# Altium footprint library LukaLIBRARY.PcbLib: 784 footprints (part 11 of 49)
Each footprint in its own frame and in the unit in brackets; x right, y up, seen from the top. Pads: shape width x height; smd on the part's side, far side on the other; paste and mask are expansions set on the pad; w line width, h text height; cw(c..) or ccw(c..) is an arc to the next point about the centre after c.
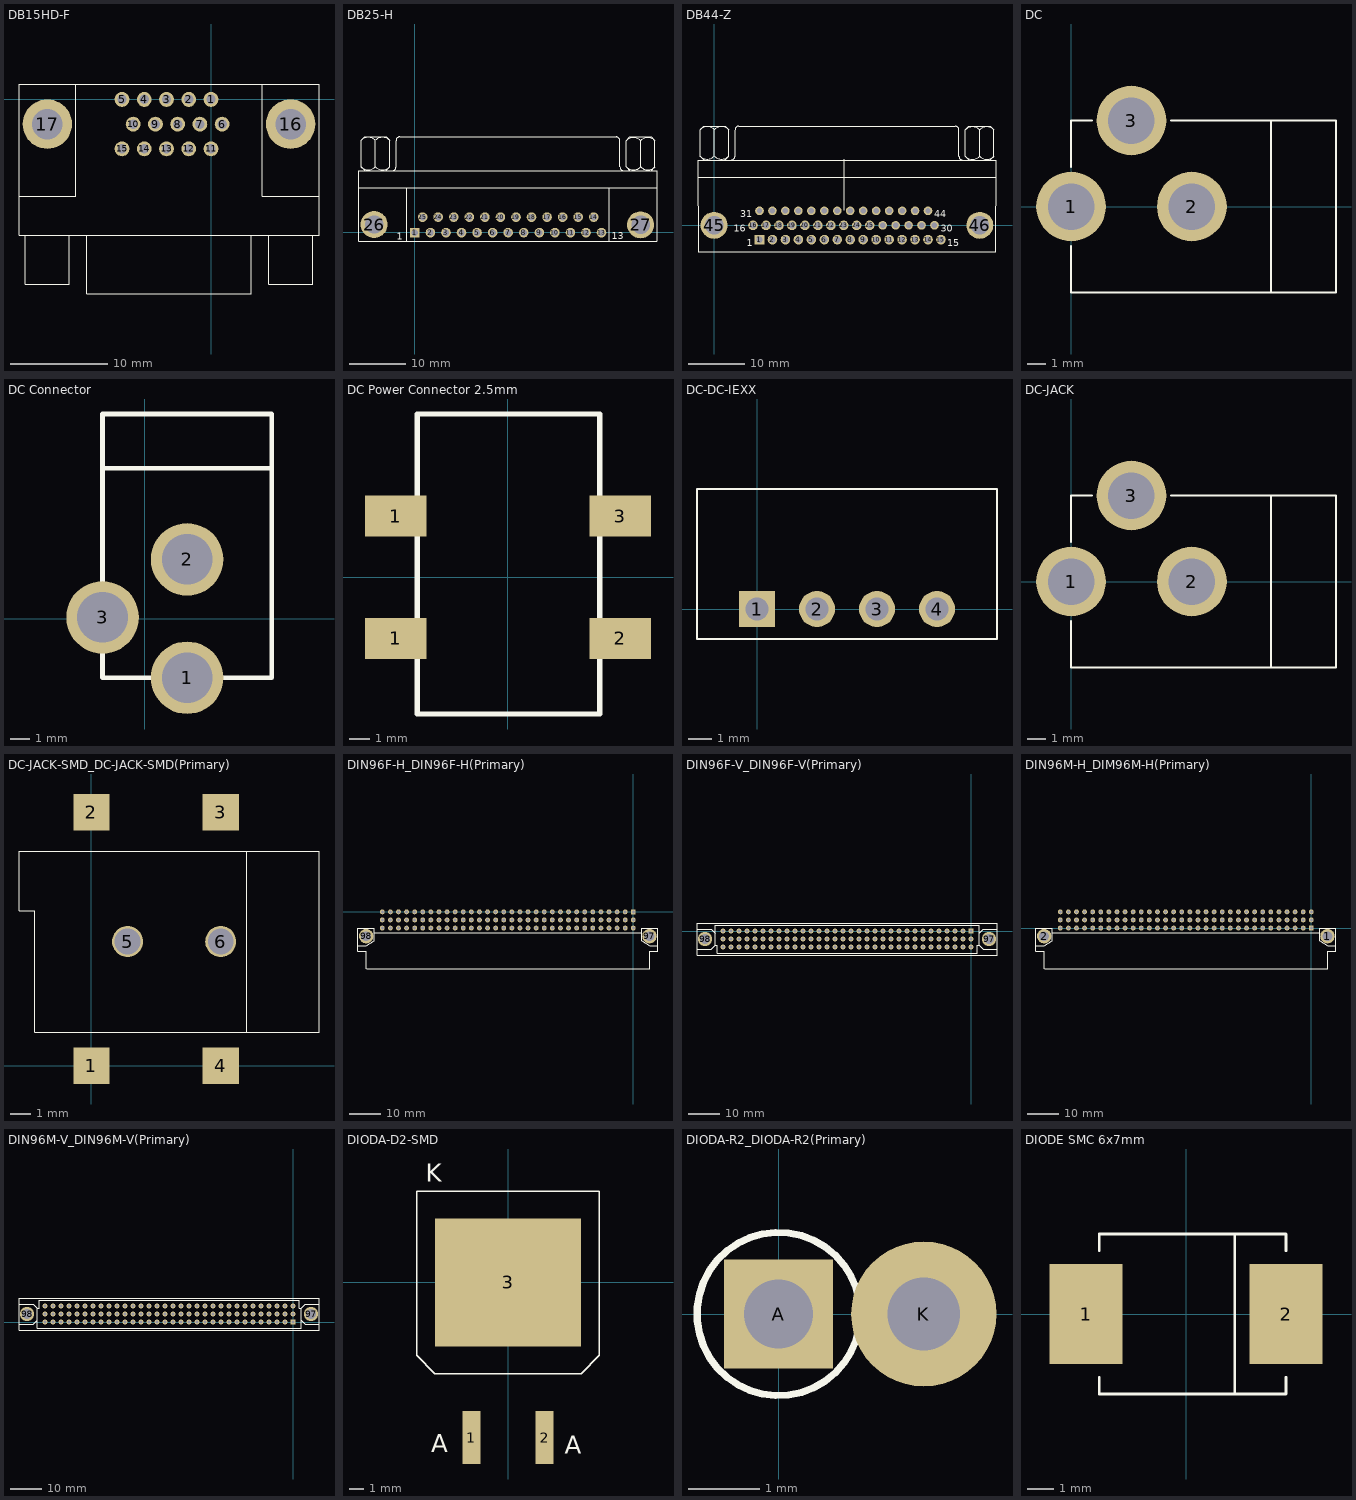
[diagram p10: the footprints below, top view; thin cyan lines are the x and y axes]

## DB15HD-F [mil]
pads (17):
  round 60 hole 38: 1(0,0) 2(-89.96,0) 3(-179.92,0) 4(-269.88,0) 5(-359.84,0) 6(44.98,-100) 7(-44.98,-100) 8(-134.94,-100) 9(-224.9,-100) 10(-314.86,-100) 11(0,-200) 12(-89.96,-200) 13(-179.92,-200) 14(-269.88,-200) 15(-359.84,-200)
  round 200 hole 124: 16(322.24,-100) 17(-662.01,-100)
Top Overlay:
  lines w1: -776.57,-392.52 -547.44,-392.52 -547.44,61.42 ; -750.59,-550 -750.59,-746.85 -573.43,-746.85 -573.43,-550 ; -502.95,-550 -502.95,-786.22 163.19,-786.22 163.19,-550 ; 207.68,61.42 207.68,-392.52 436.81,-392.52 ; 233.66,-550 233.66,-746.85 410.83,-746.85 410.83,-550 ; -776.57,-550 -776.57,61.42 436.81,61.42 436.81,-550 -776.57,-550

## DB25-H [mm]
pads (27):
  rect 1.7x1.7 hole 1.1: 1(0.023,-0.049)
  round 1.7 hole 1.1: 2(2.767,-0.049) 3(5.51,-0.049) 4(8.254,-0.049) 5(10.997,-0.049) 6(13.74,-0.049) 7(16.483,-0.049) 8(19.226,-0.049) 9(21.97,-0.049) 10(24.713,-0.049) 11(27.456,-0.049) 12(30.199,-0.049) 13(32.942,-0.049) 14(31.571,2.694) 15(28.828,2.694) 16(26.084,2.694) 17(23.341,2.694) 18(20.598,2.694) 19(17.855,2.694) 20(15.112,2.694) 21(12.368,2.694) 22(9.625,2.694) 23(6.882,2.694) 24(4.139,2.694) 25(1.396,2.694)
  round 4.76 hole 3.26: 26(-7.163,1.397) 27(39.825,1.346)
Top Overlay:
  lines w0.2: -9.855,-1.524 42.723,-1.549 ; -9.837,-1.529 -9.837,10.871 42.748,10.871 ; -9.837,7.871 42.748,7.874 ; -9.475,16.221 -9.475,11.571 -8.84,10.936 ; -9.475,16.236 -8.84,16.871 -5.03,16.871 -4.395,16.236 ; -6.935,11.571 -6.935,16.221 ; -5.03,10.936 -4.395,11.571 -4.395,16.221 ; -4.395,14.957 -4.395,15.169 ; -3.997,10.876 ccw(c-3.997,11.571) -3.302,11.571 -3.302,16.171 ; -3.297,16.176 cw(c-2.602,16.176) -2.602,16.871 ; -2.642,16.84 35.495,16.846 cw(c35.495,16.151) 36.19,16.151 ; -1.437,-1.529 -1.437,7.871 ; 34.33,-1.554 34.33,7.846 ; 36.195,16.146 36.195,11.546 ccw(c36.89,11.546) 36.89,10.851 ; 37.293,16.196 37.293,11.545 37.928,10.91 ; 37.293,16.211 37.928,16.846 41.738,16.846 42.373,16.211 ; 39.833,11.545 39.833,16.196 ; 41.738,10.91 42.373,11.545 42.373,16.196 ; 42.373,14.932 42.373,15.144 ; 42.73,-1.554 42.73,10.846
  lines w0.203: -9.477,11.568 ccw(c-8.205,12.841) -6.933,11.568 ; -9.475,16.221 cw(c-8.203,14.949) -6.931,16.221 ; -6.94,16.221 cw(c-5.667,14.949) -4.395,16.221 ; -6.937,11.568 ccw(c-5.665,12.841) -4.393,11.568 ; 37.29,11.543 ccw(c38.563,12.815) 39.835,11.543 ; 37.293,16.196 cw(c38.565,14.924) 39.837,16.196 ; 39.828,16.196 cw(c41.1,14.924) 42.373,16.196 ; 39.83,11.543 ccw(c41.103,12.815) 42.375,11.543
  text "13" at 34.722,-1.168 h1.25
  text "1" at -3.175,-1.27 h1.25

## DB44-Z [mil]
pads (46):
  rect 66.93x66.93 hole 43.31: 1(315,-100)
  round 66.93 hole 43.31: 2(405,-100) 3(495,-100) 4(585,-100) 5(675,-100) 6(765,-100) 7(855,-100) 8(945,-100) 9(1035,-100) 10(1125,-100) 11(1215,-100) 12(1305,-100) 13(1395,-100) 14(1485,-100) 15(1575,-100) 16(270,0) 17(360,0) 18(450,0) 19(540,0) 20(630,0) 21(720,0) 22(810,0) 23(900,0) 24(990,0) 25(1080,0)
  round 60 hole 38: 26(1170,0) 27(1260,0) 28(1350,0) 29(1440,0) 30(1530,0) 31(315,100) 32(405,100) 33(495,100) 34(585,100) 35(675,100) 36(765,100) 37(855,100) 38(945,100) 39(1035,100) 40(1125,100) 41(1215,100) 42(1305,100) 43(1395,100) 44(1485,100)
  round 187.4 hole 128.35: 45(0,0) 46(1845,0)
Top Overlay:
  lines w3.94: 905,105 905,460
  lines w7.87: -112.3,334.89 1958,335 ; -98.04,663.63 -98.04,480.54 -73.04,455.54 ; -98.04,664.22 -73.04,689.22 76.96,689.22 101.96,664.22 ; 1.96,480.54 1.96,663.63 ; 76.96,455.54 101.96,480.54 101.96,663.63 ; 101.96,613.87 101.96,622.21 ; 117.62,453.2 ccw(c117.62,480.56) 144.98,480.56 144.98,661.66 ; 145.18,661.86 cw(c172.54,661.86) 172.54,689.22 ; 171,688 1672.46,688.22 cw(c1672.46,660.86) 1699.82,660.86 ; 1700.02,660.66 1700.02,479.56 ccw(c1727.38,479.56) 1727.38,452.2 ; 1743.21,662.63 1743.21,479.54 1768.21,454.54 ; 1743.21,663.22 1768.21,688.22 1918.21,688.22 1943.21,663.22 ; 1843.21,479.54 1843.21,662.63 ; 1918.21,454.54 1943.21,479.54 1943.21,662.63 ; 1943.21,612.87 1943.21,621.21 ; 1957.3,452 1955,-185 -110,-185 -112.3,453 1958,453
  lines w8: -98.13,480.45 ccw(c-48.04,530.54) 2.05,480.45 ; -98.04,663.63 cw(c-47.95,613.54) 2.13,663.63 ; 1.79,663.63 cw(c51.87,613.54) 101.96,663.63 ; 1.87,480.45 ccw(c51.96,530.54) 102.05,480.45 ; 1743.13,479.45 ccw(c1793.21,529.54) 1843.3,479.45 ; 1743.21,662.63 cw(c1793.3,612.54) 1843.39,662.63 ; 1843.04,662.63 cw(c1893.13,612.54) 1943.21,662.63 ; 1843.13,479.45 ccw(c1893.21,529.54) 1943.3,479.45
  text "1" at 225,-145 h49.21
  text "15" at 1620,-145 h49.21
  text "44" at 1530,55 h49.21
  text "16" at 135,-45 h49.21
  text "30" at 1575,-45 h49.21
  text "31" at 180,55 h49.21

## DC [mil]
pads (3):
  round 150 hole 100 mask-1000: 1(0,0) 2(260,0) 3(130,185)
Top Overlay:
  lines w5: 0,-85 0,-185 570,-185 570,185 215,185 ; 0,85 0,185 45,185 ; 430,-185 430,185
Top Solder:
  region: 0,-75.36 14.7,-73.91 28.84,-69.63 41.87,-62.66 53.29,-53.29 62.66,-41.87 69.63,-28.84 73.91,-14.7 75.36,0 73.91,14.7 69.63,28.84 62.66,41.87 53.29,53.29 41.87,62.66 28.84,69.63 14.7,73.91 0,75.36 -14.7,73.91 -28.84,69.63 -41.87,62.66 -53.29,53.29 -62.66,41.87 -69.63,28.84 -73.91,14.7 -75.36,0 -73.91,-14.7 -69.63,-28.84 -62.66,-41.87 -53.29,-53.29 -41.87,-62.66 -28.84,-69.63 -14.7,-73.91
  region: 260,-75.36 274.7,-73.91 288.84,-69.63 301.87,-62.66 313.29,-53.29 322.66,-41.87 329.63,-28.84 333.91,-14.7 335.36,0 333.91,14.7 329.63,28.84 322.66,41.87 313.29,53.29 301.87,62.66 288.84,69.63 274.7,73.91 260,75.36 245.3,73.91 231.16,69.63 218.13,62.66 206.71,53.29 197.34,41.87 190.37,28.84 186.09,14.7 184.64,0 186.09,-14.7 190.37,-28.84 197.34,-41.87 206.71,-53.29 218.13,-62.66 231.16,-69.63 245.3,-73.91
  region: 130,109.64 144.7,111.09 158.84,115.37 171.87,122.34 183.29,131.71 192.66,143.13 199.63,156.16 203.91,170.3 205.36,185 203.91,199.7 199.63,213.84 192.66,226.87 183.29,238.29 171.87,247.66 158.84,254.63 144.7,258.91 130,260.36 115.3,258.91 101.16,254.63 88.13,247.66 76.71,238.29 67.34,226.87 60.37,213.84 56.09,199.7 54.64,185 56.09,170.3 60.37,156.16 67.34,143.13 76.71,131.71 88.13,122.34 101.16,115.37 115.3,111.09
Bottom Solder:
  region: 0,-75.36 14.7,-73.91 28.84,-69.63 41.87,-62.66 53.29,-53.29 62.66,-41.87 69.63,-28.84 73.91,-14.7 75.36,0 73.91,14.7 69.63,28.84 62.66,41.87 53.29,53.29 41.87,62.66 28.84,69.63 14.7,73.91 0,75.36 -14.7,73.91 -28.84,69.63 -41.87,62.66 -53.29,53.29 -62.66,41.87 -69.63,28.84 -73.91,14.7 -75.36,0 -73.91,-14.7 -69.63,-28.84 -62.66,-41.87 -53.29,-53.29 -41.87,-62.66 -28.84,-69.63 -14.7,-73.91
  region: 260,-75.36 274.7,-73.91 288.84,-69.63 301.87,-62.66 313.29,-53.29 322.66,-41.87 329.63,-28.84 333.91,-14.7 335.36,0 333.91,14.7 329.63,28.84 322.66,41.87 313.29,53.29 301.87,62.66 288.84,69.63 274.7,73.91 260,75.36 245.3,73.91 231.16,69.63 218.13,62.66 206.71,53.29 197.34,41.87 190.37,28.84 186.09,14.7 184.64,0 186.09,-14.7 190.37,-28.84 197.34,-41.87 206.71,-53.29 218.13,-62.66 231.16,-69.63 245.3,-73.91
  region: 130,109.64 144.7,111.09 158.84,115.37 171.87,122.34 183.29,131.71 192.66,143.13 199.63,156.16 203.91,170.3 205.36,185 203.91,199.7 199.63,213.84 192.66,226.87 183.29,238.29 171.87,247.66 158.84,254.63 144.7,258.91 130,260.36 115.3,258.91 101.16,254.63 88.13,247.66 76.71,238.29 67.34,226.87 60.37,213.84 56.09,199.7 54.64,185 56.09,170.3 60.37,156.16 67.34,143.13 76.71,131.71 88.13,122.34 101.16,115.37 115.3,111.09

## DC Connector [mil]
pads (3):
  round 150 hole 105: 1(87.5,-122.5) 2(87.5,122.5) 3(-87.5,2.5)
Top Overlay:
  lines w10: -87.5,311.02 262.5,311.02 ; -87.5,-122.5 262.5,-122.5 262.5,423.23 -87.5,423.23 -87.5,-122.5

## DC Power Connector 2.5mm [mm]
pads (4):
  rect 3x2 smd: 1(-5.5,-3) 1(-5.5,3) 2(5.5,-3) 3(5.5,3)
Top Overlay:
  lines w0.254: -4.45,-6.7 -4.45,8 4.5,8 4.5,-6.7 -4.45,-6.7

## DC-DC-IEXX [mil]
pads (4):
  rect 60x60 hole 38 mask-1000: 1(0,0)
  round 60 hole 38 mask-1000: 2(100,0) 3(200,0) 4(300,0)
Top Overlay:
  lines w3: -100,-50 400,-50 400,200 -100,200 -100,-50
Top Solder:
  region: 100,30.26 92.17,29.23 84.87,26.2 78.6,21.4 73.8,15.13 70.77,7.83 69.74,0 70.77,-7.83 73.8,-15.13 78.6,-21.4 84.87,-26.2 92.17,-29.23 100,-30.26 107.83,-29.23 115.13,-26.2 121.4,-21.4 126.2,-15.13 129.23,-7.83 130.26,0 129.23,7.83 126.2,15.13 121.4,21.4 115.13,26.2 107.83,29.23
  region: 300,30.26 292.17,29.23 284.87,26.2 278.6,21.4 273.8,15.13 270.77,7.83 269.74,0 270.77,-7.83 273.8,-15.13 278.6,-21.4 284.87,-26.2 292.17,-29.23 300,-30.26 307.83,-29.23 315.13,-26.2 321.4,-21.4 326.2,-15.13 329.23,-7.83 330.26,0 329.23,7.83 326.2,15.13 321.4,21.4 315.13,26.2 307.83,29.23
  region: 200,30.26 192.17,29.23 184.87,26.2 178.6,21.4 173.79,15.13 170.77,7.83 169.74,0 170.77,-7.83 173.79,-15.13 178.6,-21.4 184.87,-26.2 192.17,-29.23 200,-30.26 207.83,-29.23 215.13,-26.2 221.4,-21.4 226.21,-15.13 229.23,-7.83 230.26,0 229.23,7.83 226.21,15.13 221.4,21.4 215.13,26.2 207.83,29.23
  region: -30,-30 30,-30 30,30 -30,30
Bottom Solder:
  region: 100,30.26 92.17,29.23 84.87,26.2 78.6,21.4 73.8,15.13 70.77,7.83 69.74,0 70.77,-7.83 73.8,-15.13 78.6,-21.4 84.87,-26.2 92.17,-29.23 100,-30.26 107.83,-29.23 115.13,-26.2 121.4,-21.4 126.2,-15.13 129.23,-7.83 130.26,0 129.23,7.83 126.2,15.13 121.4,21.4 115.13,26.2 107.83,29.23
  region: 300,30.26 292.17,29.23 284.87,26.2 278.6,21.4 273.8,15.13 270.77,7.83 269.74,0 270.77,-7.83 273.8,-15.13 278.6,-21.4 284.87,-26.2 292.17,-29.23 300,-30.26 307.83,-29.23 315.13,-26.2 321.4,-21.4 326.2,-15.13 329.23,-7.83 330.26,0 329.23,7.83 326.2,15.13 321.4,21.4 315.13,26.2 307.83,29.23
  region: 200,30.26 192.17,29.23 184.87,26.2 178.6,21.4 173.79,15.13 170.77,7.83 169.74,0 170.77,-7.83 173.79,-15.13 178.6,-21.4 184.87,-26.2 192.17,-29.23 200,-30.26 207.83,-29.23 215.13,-26.2 221.4,-21.4 226.21,-15.13 229.23,-7.83 230.26,0 229.23,7.83 226.21,15.13 221.4,21.4 215.13,26.2 207.83,29.23
  region: -30,-30 30,-30 30,30 -30,30

## DC-JACK [mil]
pads (3):
  round 150 hole 100 mask-1000: 1(0,0) 2(260,0) 3(130,185)
Top Overlay:
  lines w5: 0,-85 0,-185 570,-185 570,185 215,185 ; 0,85 0,185 45,185 ; 430,-185 430,185
Top Solder:
  region: 130,109.64 144.7,111.09 158.84,115.37 171.87,122.34 183.29,131.71 192.66,143.13 199.63,156.16 203.91,170.3 205.36,185 203.91,199.7 199.63,213.84 192.66,226.87 183.29,238.29 171.87,247.66 158.84,254.63 144.7,258.91 130,260.36 115.3,258.91 101.16,254.63 88.13,247.66 76.71,238.29 67.34,226.87 60.37,213.84 56.09,199.7 54.64,185 56.09,170.3 60.37,156.16 67.34,143.13 76.71,131.71 88.13,122.34 101.16,115.37 115.3,111.09
  region: 260,-75.36 274.7,-73.91 288.84,-69.63 301.87,-62.66 313.29,-53.29 322.66,-41.87 329.63,-28.84 333.91,-14.7 335.36,0 333.91,14.7 329.63,28.84 322.66,41.87 313.29,53.29 301.87,62.66 288.84,69.63 274.7,73.91 260,75.36 245.3,73.91 231.16,69.63 218.13,62.66 206.71,53.29 197.34,41.87 190.37,28.84 186.09,14.7 184.64,0 186.09,-14.7 190.37,-28.84 197.34,-41.87 206.71,-53.29 218.13,-62.66 231.16,-69.63 245.3,-73.91
  region: 0,-75.36 14.7,-73.91 28.84,-69.63 41.87,-62.66 53.29,-53.29 62.66,-41.87 69.63,-28.84 73.91,-14.7 75.36,0 73.91,14.7 69.63,28.84 62.66,41.87 53.29,53.29 41.87,62.66 28.84,69.63 14.7,73.91 0,75.36 -14.7,73.91 -28.84,69.63 -41.87,62.66 -53.29,53.29 -62.66,41.87 -69.63,28.84 -73.91,14.7 -75.36,0 -73.91,-14.7 -69.63,-28.84 -62.66,-41.87 -53.29,-53.29 -41.87,-62.66 -28.84,-69.63 -14.7,-73.91
Bottom Solder:
  region: 130,109.64 144.7,111.09 158.84,115.37 171.87,122.34 183.29,131.71 192.66,143.13 199.63,156.16 203.91,170.3 205.36,185 203.91,199.7 199.63,213.84 192.66,226.87 183.29,238.29 171.87,247.66 158.84,254.63 144.7,258.91 130,260.36 115.3,258.91 101.16,254.63 88.13,247.66 76.71,238.29 67.34,226.87 60.37,213.84 56.09,199.7 54.64,185 56.09,170.3 60.37,156.16 67.34,143.13 76.71,131.71 88.13,122.34 101.16,115.37 115.3,111.09
  region: 260,-75.36 274.7,-73.91 288.84,-69.63 301.87,-62.66 313.29,-53.29 322.66,-41.87 329.63,-28.84 333.91,-14.7 335.36,0 333.91,14.7 329.63,28.84 322.66,41.87 313.29,53.29 301.87,62.66 288.84,69.63 274.7,73.91 260,75.36 245.3,73.91 231.16,69.63 218.13,62.66 206.71,53.29 197.34,41.87 190.37,28.84 186.09,14.7 184.64,0 186.09,-14.7 190.37,-28.84 197.34,-41.87 206.71,-53.29 218.13,-62.66 231.16,-69.63 245.3,-73.91
  region: 0,-75.36 14.7,-73.91 28.84,-69.63 41.87,-62.66 53.29,-53.29 62.66,-41.87 69.63,-28.84 73.91,-14.7 75.36,0 73.91,14.7 69.63,28.84 62.66,41.87 53.29,53.29 41.87,62.66 28.84,69.63 14.7,73.91 0,75.36 -14.7,73.91 -28.84,69.63 -41.87,62.66 -53.29,53.29 -62.66,41.87 -69.63,28.84 -73.91,14.7 -75.36,0 -73.91,-14.7 -69.63,-28.84 -62.66,-41.87 -53.29,-53.29 -41.87,-62.66 -28.84,-69.63 -14.7,-73.91

## DC-JACK-SMD_DC-JACK-SMD(Primary) [mil]
pads (6):
  rect 70x70 smd: 1(0,0) 2(0,490) 3(250,490) 4(250,0)
  round 60 hole 50 unplated: 5(70,240) 6(250,240)
Top Overlay:
  lines w1: 300,65 300,415 ; -140,300 -110,300 -110,65 440,65 440,415 -140,415 -140,300

## DIN96F-H_DIN96F-H(Primary) [mil]
pads (98):
  round 180 hole 120: 97(200,-300) 98(-3300,-300)
  rect 60x60 hole 38 mask-1000: A1(0,0)
  round 60 hole 38 mask-1000: A2(-100,0) A3(-200,0) A4(-300,0) A5(-400,0) A6(-500,0) A7(-600,0) A8(-700,0) A9(-800,0) A10(-900,0) A11(-1000,0) A12(-1100,0) A13(-1200,0) A14(-1300,0) A15(-1400,0) A16(-1500,0) A17(-1600,0) A18(-1700,0) A19(-1800,0) A20(-1900,0) A21(-2000,0) A22(-2100,0) A23(-2200,0) A24(-2300,0) A25(-2400,0) A26(-2500,0) A27(-2600,0) A28(-2700,0) A29(-2800,0) A30(-2900,0) A31(-3000,0) A32(-3100,0) B1(0,-100) B2(-100,-100) B3(-200,-100) B4(-300,-100) B5(-400,-100) B6(-500,-100) B7(-600,-100) B8(-700,-100) B9(-800,-100) B10(-900,-100) B11(-1000,-100) B12(-1100,-100) B13(-1200,-100) B14(-1300,-100) B15(-1400,-100) B16(-1500,-100) B17(-1600,-100) B18(-1700,-100) B19(-1800,-100) B20(-1900,-100) B21(-2000,-100) B22(-2100,-100) B23(-2200,-100) B24(-2300,-100) B25(-2400,-100) B26(-2500,-100) B27(-2600,-100) B28(-2700,-100) B29(-2800,-100) B30(-2900,-100) B31(-3000,-100) B32(-3100,-100) C1(0,-200) C2(-100,-200) C3(-200,-200) C4(-300,-200) C5(-400,-200) C6(-500,-200) C7(-600,-200) C8(-700,-200) C9(-800,-200) C10(-900,-200) C11(-1000,-200) C12(-1100,-200) C13(-1200,-200) C14(-1300,-200) C15(-1400,-200) C16(-1500,-200) C17(-1600,-200) C18(-1700,-200) C19(-1800,-200) C20(-1900,-200) C21(-2000,-200) C22(-2100,-200) C23(-2200,-200) C24(-2300,-200) C25(-2400,-200) C26(-2500,-200) C27(-2600,-200) C28(-2700,-200) C29(-2800,-200) C30(-2900,-200) C31(-3000,-200) C32(-3100,-200)
Top Overlay:
  lines w1: -3400,-420 -3300,-420 -3200,-355 -3200,-255 ; 105,-255 105,-355 205,-420 305,-420
  lines w10: -3300,-700 -3300,-485 -3400,-485 -3400,-205 -3200,-205 -3200,-255 105,-255 105,-205 305,-205 305,-485 205,-485 205,-700 -3295,-700
Top Solder:
  drawing of 96 lines, arcs and shapes, not listed
Bottom Solder:
  drawing of 96 lines, arcs and shapes, not listed

## DIN96F-V_DIN96F-V(Primary) [mil]
pads (98):
  round 180 hole 120: 97(225,-100) 98(-3325,-100)
  rect 60x60 hole 38 mask-1000: A1(0,0)
  round 60 hole 38 mask-1000: A2(-100,0) A3(-200,0) A4(-300,0) A5(-400,0) A6(-500,0) A7(-600,0) A8(-700,0) A9(-800,0) A10(-900,0) A11(-1000,0) A12(-1100,0) A13(-1200,0) A14(-1300,0) A15(-1400,0) A16(-1500,0) A17(-1600,0) A18(-1700,0) A19(-1800,0) A20(-1900,0) A21(-2000,0) A22(-2100,0) A23(-2200,0) A24(-2300,0) A25(-2400,0) A26(-2500,0) A27(-2600,0) A28(-2700,0) A29(-2800,0) A30(-2900,0) A31(-3000,0) A32(-3100,0) B1(0,-100) B2(-100,-100) B3(-200,-100) B4(-300,-100) B5(-400,-100) B6(-500,-100) B7(-600,-100) B8(-700,-100) B9(-800,-100) B10(-900,-100) B11(-1000,-100) B12(-1100,-100) B13(-1200,-100) B14(-1300,-100) B15(-1400,-100) B16(-1500,-100) B17(-1600,-100) B18(-1700,-100) B19(-1800,-100) B20(-1900,-100) B21(-2000,-100) B22(-2100,-100) B23(-2200,-100) B24(-2300,-100) B25(-2400,-100) B26(-2500,-100) B27(-2600,-100) B28(-2700,-100) B29(-2800,-100) B30(-2900,-100) B31(-3000,-100) B32(-3100,-100) C1(0,-200) C2(-100,-200) C3(-200,-200) C4(-300,-200) C5(-400,-200) C6(-500,-200) C7(-600,-200) C8(-700,-200) C9(-800,-200) C10(-900,-200) C11(-1000,-200) C12(-1100,-200) C13(-1200,-200) C14(-1300,-200) C15(-1400,-200) C16(-1500,-200) C17(-1600,-200) C18(-1700,-200) C19(-1800,-200) C20(-1900,-200) C21(-2000,-200) C22(-2100,-200) C23(-2200,-200) C24(-2300,-200) C25(-2400,-200) C26(-2500,-200) C27(-2600,-200) C28(-2700,-200) C29(-2800,-200) C30(-2900,-200) C31(-3000,-200) C32(-3100,-200)
Top Overlay:
  lines w1: -3425,-225 -3250,-225 -3200,-175 ; -3425,25 -3250,25 -3200,-25 ; 325,-225 150,-225 100,-175 ; 325,25 150,25 100,-25 ; -3200,-175 -3200,-125 -3200,-25 ; -3200,-175 -3175,-175 -3175,-275 75,-275 75,-175 100,-175 ; -3200,-25 -3200,75 100,75 100,-25 ; 100,-175 100,-75 100,-25
  lines w10: -3425,-300 -3425,100 325,100 325,-300 -3425,-300
Top Solder:
  drawing of 96 lines, arcs and shapes, not listed
Bottom Solder:
  drawing of 96 lines, arcs and shapes, not listed

## DIN96M-H_DIM96M-H(Primary) [mil]
pads (98):
  round 180 hole 120: 1(200,-100) 2(-3300,-100)
  rect 60x60 hole 38 mask-1000: A1(0,0)
  round 60 hole 38 mask-1000: A2(-100,0) A3(-200,0) A4(-300,0) A5(-400,0) A6(-500,0) A7(-600,0) A8(-700,0) A9(-800,0) A10(-900,0) A11(-1000,0) A12(-1100,0) A13(-1200,0) A14(-1300,0) A15(-1400,0) A16(-1500,0) A17(-1600,0) A18(-1700,0) A19(-1800,0) A20(-1900,0) A21(-2000,0) A22(-2100,0) A23(-2200,0) A24(-2300,0) A25(-2400,0) A26(-2500,0) A27(-2600,0) A28(-2700,0) A29(-2800,0) A30(-2900,0) A31(-3000,0) A32(-3100,0) B1(0,100) B2(-100,100) B3(-200,100) B4(-300,100) B5(-400,100) B6(-500,100) B7(-600,100) B8(-700,100) B9(-800,100) B10(-900,100) B11(-1000,100) B12(-1100,100) B13(-1200,100) B14(-1300,100) B15(-1400,100) B16(-1500,100) B17(-1600,100) B18(-1700,100) B19(-1800,100) B20(-1900,100) B21(-2000,100) B22(-2100,100) B23(-2200,100) B24(-2300,100) B25(-2400,100) B26(-2500,100) B27(-2600,100) B28(-2700,100) B29(-2800,100) B30(-2900,100) B31(-3000,100) B32(-3100,100) C1(0,200) C2(-100,200) C3(-200,200) C4(-300,200) C5(-400,200) C6(-500,200) C7(-600,200) C8(-700,200) C9(-800,200) C10(-900,200) C11(-1000,200) C12(-1100,200) C13(-1200,200) C14(-1300,200) C15(-1400,200) C16(-1500,200) C17(-1600,200) C18(-1700,200) C19(-1800,200) C20(-1900,200) C21(-2000,200) C22(-2100,200) C23(-2200,200) C24(-2300,200) C25(-2400,200) C26(-2500,200) C27(-2600,200) C28(-2700,200) C29(-2800,200) C30(-2900,200) C31(-3000,200) C32(-3100,200)
Top Overlay:
  lines w1: -3400,-220 -3300,-220 -3200,-155 -3200,-55 ; 105,-55 105,-155 205,-220 305,-220
  lines w10: -3300,-500 -3300,-285 -3400,-285 -3400,-5 -3200,-5 -3200,-55 105,-55 105,-5 305,-5 305,-285 205,-285 205,-500 -3295,-500
Top Solder:
  drawing of 96 lines, arcs and shapes, not listed
Bottom Solder:
  drawing of 96 lines, arcs and shapes, not listed

## DIN96M-V_DIN96M-V(Primary) [mil]
pads (98):
  round 180 hole 120: 97(225,100) 98(-3325,100)
  rect 60x60 hole 38 mask-1000: A1(0,0)
  round 60 hole 38 mask-1000: A2(-100,0) A3(-200,0) A4(-300,0) A5(-400,0) A6(-500,0) A7(-600,0) A8(-700,0) A9(-800,0) A10(-900,0) A11(-1000,0) A12(-1100,0) A13(-1200,0) A14(-1300,0) A15(-1400,0) A16(-1500,0) A17(-1600,0) A18(-1700,0) A19(-1800,0) A20(-1900,0) A21(-2000,0) A22(-2100,0) A23(-2200,0) A24(-2300,0) A25(-2400,0) A26(-2500,0) A27(-2600,0) A28(-2700,0) A29(-2800,0) A30(-2900,0) A31(-3000,0) A32(-3100,0) B1(0,100) B2(-100,100) B3(-200,100) B4(-300,100) B5(-400,100) B6(-500,100) B7(-600,100) B8(-700,100) B9(-800,100) B10(-900,100) B11(-1000,100) B12(-1100,100) B13(-1200,100) B14(-1300,100) B15(-1400,100) B16(-1500,100) B17(-1600,100) B18(-1700,100) B19(-1800,100) B20(-1900,100) B21(-2000,100) B22(-2100,100) B23(-2200,100) B24(-2300,100) B25(-2400,100) B26(-2500,100) B27(-2600,100) B28(-2700,100) B29(-2800,100) B30(-2900,100) B31(-3000,100) B32(-3100,100) C1(0,200) C2(-100,200) C3(-200,200) C4(-300,200) C5(-400,200) C6(-500,200) C7(-600,200) C8(-700,200) C9(-800,200) C10(-900,200) C11(-1000,200) C12(-1100,200) C13(-1200,200) C14(-1300,200) C15(-1400,200) C16(-1500,200) C17(-1600,200) C18(-1700,200) C19(-1800,200) C20(-1900,200) C21(-2000,200) C22(-2100,200) C23(-2200,200) C24(-2300,200) C25(-2400,200) C26(-2500,200) C27(-2600,200) C28(-2700,200) C29(-2800,200) C30(-2900,200) C31(-3000,200) C32(-3100,200)
Top Overlay:
  lines w1: -3425,-25 -3250,-25 -3200,25 ; -3425,225 -3250,225 -3200,175 ; 100,25 150,-25 325,-25 ; 325,225 150,225 100,175 ; -3200,175 -3200,-75 100,-75 100,175 ; -3200,175 -3175,175 -3175,275 75,275 75,175 100,175
  lines w10: -3425,-100 325,-100 325,300 -3425,300 -3425,-100
Top Solder:
  drawing of 96 lines, arcs and shapes, not listed
Bottom Solder:
  drawing of 96 lines, arcs and shapes, not listed

## DIODA-D2-SMD [mil]
pads (3):
  rect 50x145 smd mask-1000: 1(-100,-425) 2(100,-425)
  rect 400x350 smd mask-1000: 3(0,0)
Top Overlay:
  lines w3.94: -250,-200 -200,-250 200,-250 250,-200 250,250 -250,250 -250,-200
  text "A" at -210,-465 h49.21
  text "K" at -225,275 h49.21
  text "A" at 155,-470 h49.21
Top Solder:
  region: 75,-497.5 125,-497.5 125,-352.5 75,-352.5
  region: -125,-497.5 -75,-497.5 -75,-352.5 -125,-352.5
  region: -200,-175 200,-175 200,175 -200,175

## DIODA-R2_DIODA-R2(Primary) [mil]
pads (2):
  rect 60x60 hole 38 mask-1000: A(0,0)
  round 80 hole 40 mask-1000: K(80,0)
Top Overlay:
  circle w3.94: c0,0 r45
Top Solder:
  region: 80,40.35 69.56,38.97 59.83,34.94 51.47,28.53 45.06,20.17 41.03,10.44 39.65,0 41.03,-10.44 45.06,-20.17 51.47,-28.53 59.83,-34.94 69.56,-38.97 80,-40.35 90.44,-38.97 100.17,-34.94 108.53,-28.53 114.94,-20.17 118.97,-10.44 120.35,0 118.97,10.44 114.94,20.17 108.53,28.53 100.17,34.94 90.44,38.97
  region: -30,-30 30,-30 30,30 -30,30
Bottom Solder:
  region: 80,40.35 69.56,38.97 59.83,34.94 51.47,28.53 45.06,20.17 41.03,10.44 39.65,0 41.03,-10.44 45.06,-20.17 51.47,-28.53 59.83,-34.94 69.56,-38.97 80,-40.35 90.44,-38.97 100.17,-34.94 108.53,-28.53 114.94,-20.17 118.97,-10.44 120.35,0 118.97,10.44 114.94,20.17 108.53,28.53 100.17,34.94 90.44,38.97
  region: -30,-30 30,-30 30,30 -30,30

## DIODE SMC 6x7mm [mil] "Diode; 2 Leads"
pads (2):
  rect 110x150 smd: 1(-150,0) 2(150,0)
Top Overlay:
  lines w3.94: -130,-95 -130,-120 150,-120 150,-95 ; -130,95 -130,120 150,120 150,95 ; 73,-120 73,119
Mechanical 1:
  lines w1: -130,-120 150,-120 ; -130,120 150,120